# Altium footprint library Hydrolib_pcb.PcbLib: 101 footprints (part 5 of 7)
Each footprint in its own frame and in the unit in brackets; x right, y up, seen from the top. Pads: shape width x height; smd on the part's side, far side on the other; paste and mask are expansions set on the pad; w line width, h text height; cw(c..) or ccw(c..) is an arc to the next point about the centre after c.
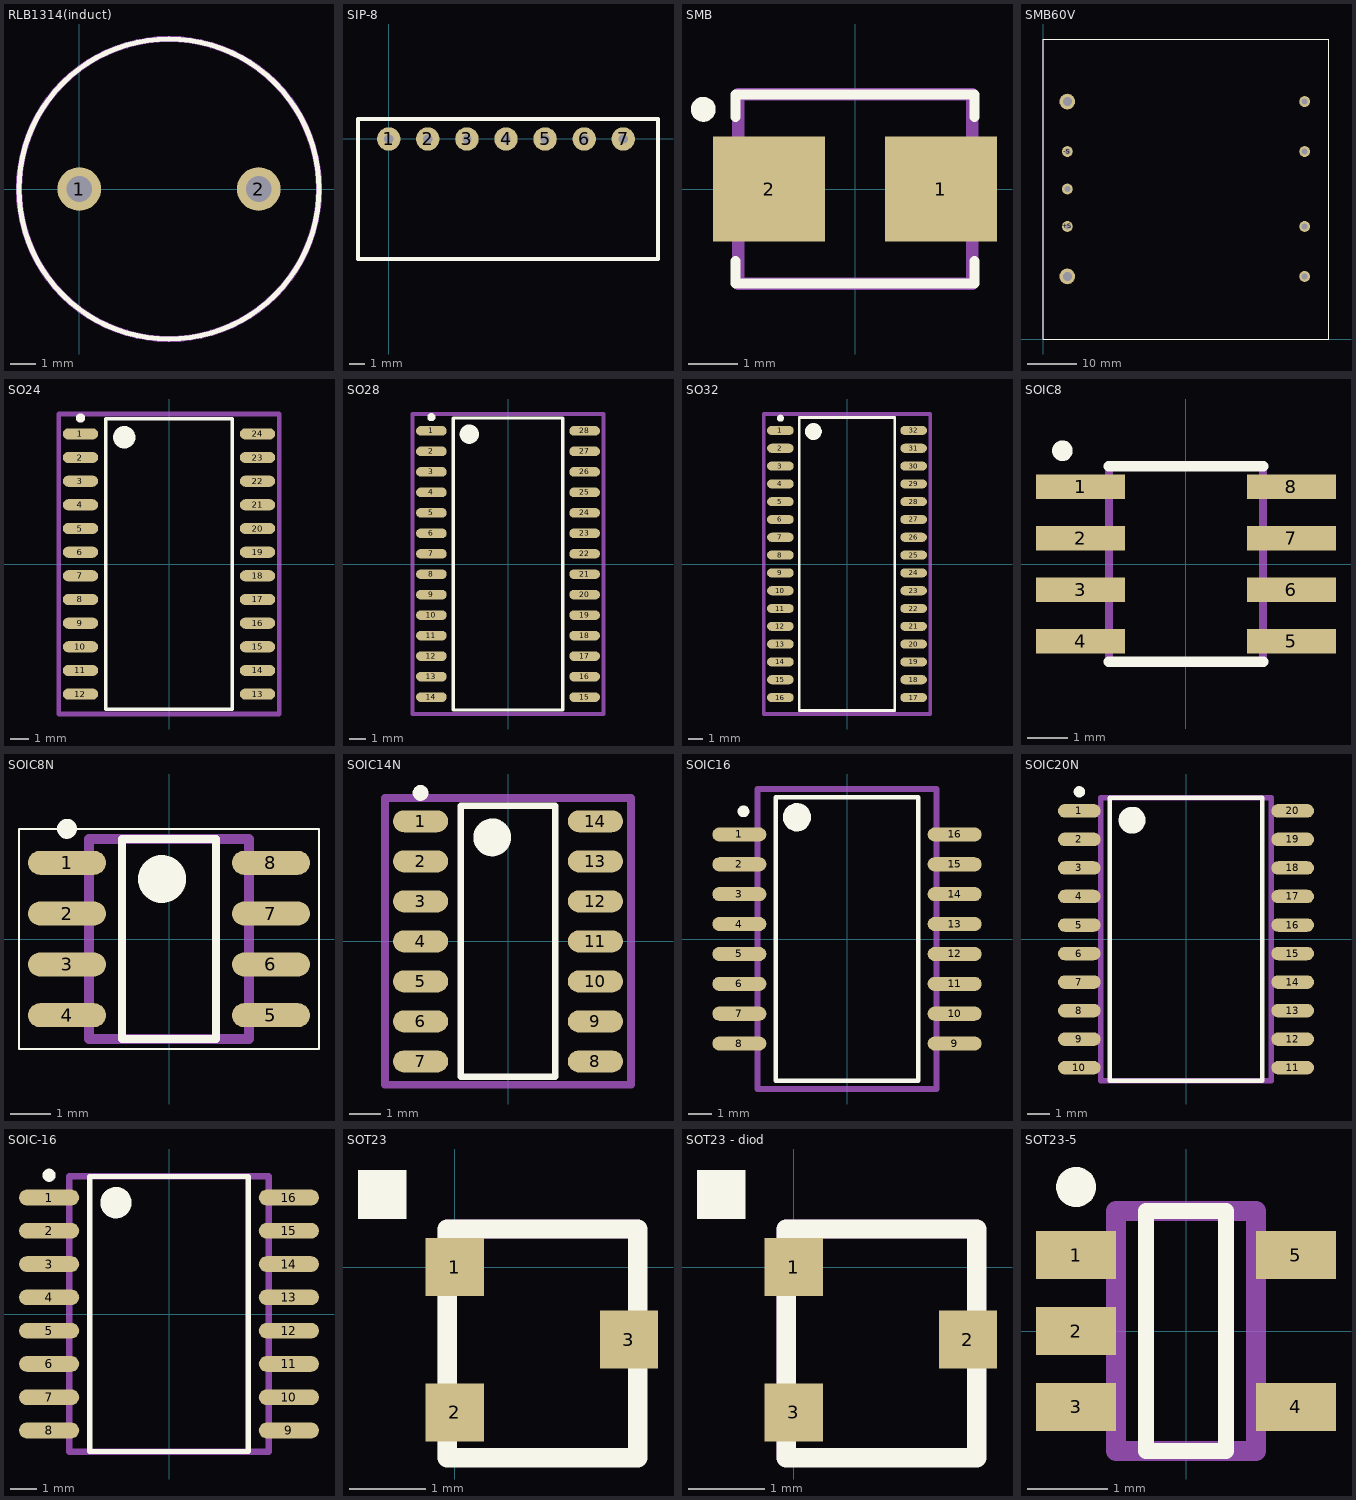
[diagram p4: the footprints below, top view; thin cyan lines are the x and y axes]

## RLB1314(induct) [mm]
pads (2):
  round 1.7 hole 1: 1(0,0) 2(7,0)
Top Overlay:
  circle w0.2: c3.5,0 r5.85
Pattern top:
  circle w0.25: c3.5,0 r5.85
  text ".Designator" at -1.5,-0.4 h2.15
3D body "rlb1314.step": height 12, standoff -15, extent -2.35,-5.95 9.35,5.75

## SIP-8 [mil]
pads (7):
  round 60 hole 23.62: 1(0,0) 2(100,0) 3(200,0) 4(300,0) 5(400,0) 6(500,0) 7(600,0)
Top Overlay:
  lines w9.84: -78.74,51.18 688.98,51.18 688.98,-307.09 ; 688.98,-307.09 688.98,-307.09
  lines w10: -78.74,51.18 -78.74,-307.09 688.98,-307.09

## SMB [mm] "Diod"
height 2.4
pads (2):
  rect 2.25x2.1 smd: 1(1.725,0) 2(-1.725,0)
Top Overlay:
  circle w0.25: c-3.05,1.6 r0.125
  lines w0.2: -2.4,-1.45 -2.4,-1.9 2.4,-1.9 2.4,-1.45 ; -2.4,1.45 -2.4,1.9 2.4,1.9 2.4,1.45
Pattern top:
  lines w0.25: -2.35,-1.9 -2.35,1.9 2.35,1.9 2.35,-1.9 -2.35,-1.9
  text ".Designator" at -3.3,2.2 h2.15
3D body "SMB.step": height 2.4, standoff 0, extent -2.57,-1.9 2.57,1.9

## SMB60V [mm]
height 13
pads (9):
  round 2.2 hole 1.2: +S(4.875,22.88) +Vin(53.125,12.72) -S(4.875,38.12) -Vin(53.125,48.28) GND(53.125,38.12) ON/OFF(53.125,22.88) Trim(4.875,30.5)
  round 3.2 hole 1.8: +Vout(4.875,12.72) -Vout(4.875,48.28)
Top Overlay:
  lines w0.254: 0,0 58,0 58,61 0,61 0,0
Pattern top:
  lines w0.22: 0,0 0,61 58,61 58,0 0,0
  text ".Designator" at 23.1,39.5 h2.15
3D body: height 13, standoff 0, extent -0.127,-0.127 58.127,61.127

## SO24 [mm] "SOP, 24-Leads, Body 15,40x7,50mm, Pitch 1,27mm, IPC Medium Density"
height 2.65
pads (24):
  oval 1.9x0.6 smd: 1(-4.75,6.985) 2(-4.75,5.715) 3(-4.75,4.445) 4(-4.75,3.175) 5(-4.75,1.905) 6(-4.75,0.635) 7(-4.75,-0.635) 8(-4.75,-1.905) 9(-4.75,-3.175) 10(-4.75,-4.445) 11(-4.75,-5.715) 12(-4.75,-6.985) 13(4.75,-6.985) 14(4.75,-5.715) 15(4.75,-4.445) 16(4.75,-3.175) 17(4.75,-1.905) 18(4.75,-0.635) 19(4.75,0.635) 20(4.75,1.905) 21(4.75,3.175) 22(4.75,4.445) 23(4.75,5.715) 24(4.75,6.985)
Top Overlay:
  circle w0.6: c-2.4,6.8 r0.3
  circle w0.25: c-4.75,7.835 r0.125
  lines w0.2: -3.4,-7.8 3.4,-7.8 3.4,7.8 -3.4,7.8 -3.4,-7.8
Pattern top:
  lines w0.25: -5.925,-8.05 5.925,-8.05 5.925,8.05 -5.925,8.05 -5.925,-8.05
3D body "SOP127P1030X265-24N.step": height 2.65, standoff 0, extent -5.162,-7.8 5.162,7.8

## SO28 [mm]
height 2.65
pads (28):
  oval 1.9x0.6 smd: 1(-4.75,8.255) 2(-4.75,6.985) 3(-4.75,5.715) 4(-4.75,4.445) 5(-4.75,3.175) 6(-4.75,1.905) 7(-4.75,0.635) 8(-4.75,-0.635) 9(-4.75,-1.905) 10(-4.75,-3.175) 11(-4.75,-4.445) 12(-4.75,-5.715) 13(-4.75,-6.985) 14(-4.75,-8.255) 15(4.75,-8.255) 16(4.75,-6.985) 17(4.75,-5.715) 18(4.75,-4.445) 19(4.75,-3.175) 20(4.75,-1.905) 21(4.75,-0.635) 22(4.75,0.635) 23(4.75,1.905) 24(4.75,3.175) 25(4.75,4.445) 26(4.75,5.715) 27(4.75,6.985) 28(4.75,8.255)
Top Overlay:
  circle w0.6: c-2.4,8.05 r0.3
  circle w0.25: c-4.75,9.105 r0.125
  lines w0.2: -3.4,-9.05 3.4,-9.05 3.4,9.05 -3.4,9.05 -3.4,-9.05
Pattern top:
  lines w0.25: -5.925,-9.3 5.925,-9.3 5.925,9.3 -5.925,9.3 -5.925,-9.3
  text ".Designator" at 0.2,-4.5 h2.15
3D body "SO28.step": height 2.65, standoff 0, extent -5.162,-9.05 5.162,9.05

## SO32 [mm] "SOP, 32-Leads, Body 20,72x7,51mm, Pitch 1,27mm, IPC Medium Density"
height 2.54
pads (32):
  oval 1.9x0.65 smd: 1(-4.75,9.525) 2(-4.75,8.255) 3(-4.75,6.985) 4(-4.75,5.715) 5(-4.75,4.445) 6(-4.75,3.175) 7(-4.75,1.905) 8(-4.75,0.635) 9(-4.75,-0.635) 10(-4.75,-1.905) 11(-4.75,-3.175) 12(-4.75,-4.445) 13(-4.75,-5.715) 14(-4.75,-6.985) 15(-4.75,-8.255) 16(-4.75,-9.525) 17(4.75,-9.525) 18(4.75,-8.255) 19(4.75,-6.985) 20(4.75,-5.715) 21(4.75,-4.445) 22(4.75,-3.175) 23(4.75,-1.905) 24(4.75,-0.635) 25(4.75,0.635) 26(4.75,1.905) 27(4.75,3.175) 28(4.75,4.445) 29(4.75,5.715) 30(4.75,6.985) 31(4.75,8.255) 32(4.75,9.525)
Top Overlay:
  circle w0.25: c-4.75,10.4 r0.125
  circle w0.6: c-2.4,9.45 r0.3
  lines w0.2: -3.4,-10.45 -3.4,10.45 3.4,10.45 3.4,-10.45 -3.4,-10.45
Pattern top:
  lines w0.25: -5.925,-10.7 -5.925,10.7 5.925,10.7 5.925,-10.7 -5.925,-10.7
  text ".Designator" at 0.5,-4.7 h2.15
3D body "SO32.step": height 2.54, standoff 0, extent -5.232,-10.45 5.232,10.45

## SOIC8 [mm]
pads (8):
  rect 2.2x0.6 smd: 1(-2.6,1.905) 2(-2.6,0.635) 3(-2.6,-0.635) 4(-2.6,-1.905) 5(2.6,-1.905) 6(2.6,-0.635) 7(2.6,0.635) 8(2.6,1.905)
Top Overlay:
  circle w0.254: c-3.048,2.794 r0.127
  lines w0.254: -1.905,-2.413 1.905,-2.413 ; -1.905,2.413 1.905,2.413
3D top:
  lines w0.203: -1.4,-2.4 1.9,-2.4
Pattern top:
  lines w0.203: -1.4,-2.4 -1.9,-2.4 -1.9,2.4 -1.4,2.4 1.9,2.4 1.9,-2.4
  text ".Designator" at 0.5,3.775 h2.15
3D body "L9616-TR.STEP": height 1.75, standoff 0, extent -3.127,-2.45 2.873,2.45

## SOIC8N [mm] "SOIC, 8-Leads, Body 4,90x3,90mm, Pitch 1,27mm, IPC Medium Density"
height 1.75
pads (8):
  oval 1.95x0.6 smd: 1(-2.55,1.905) 2(-2.55,0.635) 3(-2.55,-0.635) 4(-2.55,-1.905) 5(2.55,-1.905) 6(2.55,-0.635) 7(2.55,0.635) 8(2.55,1.905)
Top Overlay:
  circle w0.25: c-2.55,2.755 r0.125
  circle w0.6: c-0.175,1.5 r0.3
  lines w0.05: -3.75,-2.75 -3.75,2.75 3.75,2.75 3.75,-2.75 -3.75,-2.75
  lines w0.2: -1.175,-2.5 -1.175,2.5 1.175,2.5 1.175,-2.5 -1.175,-2.5
Pattern top:
  lines w0.25: -2,-2.5 -2,2.5 2,2.5 2,-2.5 -2,-2.5
  text ".Designator" at 0.6,-2.1 h2.15
3D body: height 1.75, standoff 0.2, extent -2,-2.5 2,2.5

## SOIC14N [mm] "SOIC, 14-Leads, Body 8,65x3,90mm, Pitch 1,27mm, IPC Medium Density"
height 1.75
pads (14):
  oval 1.75x0.7 smd: 1(-2.775,3.81) 2(-2.775,2.54) 3(-2.775,1.27) 4(-2.775,0) 5(-2.775,-1.27) 6(-2.775,-2.54) 7(-2.775,-3.81) 8(2.775,-3.81) 9(2.775,-2.54) 10(2.775,-1.27) 11(2.775,0) 12(2.775,1.27) 13(2.775,2.54) 14(2.775,3.81)
Top Overlay:
  circle w0.6: c-0.5,3.3 r0.3
  circle w0.25: c-2.775,4.71 r0.125
  lines w0.2: -1.5,-4.3 1.5,-4.3 1.5,4.3 -1.5,4.3 -1.5,-4.3
Pattern top:
  lines w0.25: -3.9,-4.55 3.9,-4.55 3.9,4.55 -3.9,4.55 -3.9,-4.55
  text ".Designator" at 0.8,-4.6 h2.13
3D body "SOIC127P600X175-14N.step": height 1.75, standoff 0, extent -3,-4.3 3,4.3

## SOIC16 [mm] "SOIC, 16-Leads, Body 10,30x7,50mm, Pitch 1,27mm, IPC Medium Density"
height 2.65
pads (16):
  oval 2.3x0.6 smd: 1(-4.575,4.445) 2(-4.575,3.175) 3(-4.575,1.905) 4(-4.575,0.635) 5(-4.575,-0.635) 6(-4.575,-1.905) 7(-4.575,-3.175) 8(-4.575,-4.445) 9(4.575,-4.445) 10(4.575,-3.175) 11(4.575,-1.905) 12(4.575,-0.635) 13(4.575,0.635) 14(4.575,1.905) 15(4.575,3.175) 16(4.575,4.445)
Top Overlay:
  circle w0.6: c-2.125,5.175 r0.3
  circle w0.25: c-4.4,5.425 r0.125
  lines w0.2: -3.025,-6.025 3.025,-6.025 3.025,6.025 -3.025,6.025 -3.025,-6.025
Pattern top:
  lines w0.25: -3.8,-6.375 3.8,-6.375 3.8,6.375 -3.8,6.375 -3.8,-6.375
  text ".Designator" at 0,10.203 h2.15
3D body: height 2.65, standoff 0.2, extent -3.8,-5.25 3.8,5.25

## SOIC20N [mm] "SOIC, 20-Leads, Body 12,80x7,50mm, Pitch 1,27mm, IPC Medium Density"
height 2.65
pads (20):
  oval 1.9x0.6 smd: 1(-4.75,5.715) 2(-4.75,4.445) 3(-4.75,3.175) 4(-4.75,1.905) 5(-4.75,0.635) 6(-4.75,-0.635) 7(-4.75,-1.905) 8(-4.75,-3.175) 9(-4.75,-4.445) 10(-4.75,-5.715) 11(4.75,-5.715) 12(4.75,-4.445) 13(4.75,-3.175) 14(4.75,-1.905) 15(4.75,-0.635) 16(4.75,0.635) 17(4.75,1.905) 18(4.75,3.175) 19(4.75,4.445) 20(4.75,5.715)
Top Overlay:
  circle w0.6: c-2.4,5.3 r0.3
  circle w0.25: c-4.75,6.565 r0.125
  lines w0.2: -3.4,-6.3 3.4,-6.3 3.4,6.3 -3.4,6.3 -3.4,-6.3
Pattern top:
  lines w0.25: -3.8,-6.3 3.8,-6.3 3.8,6.3 -3.8,6.3 -3.8,-6.3
  text "String" at -2.9,7.5 h2.13
3D body: height 2.65, standoff 0.1, extent -3.8,-6.3 3.8,6.3

## SOIC-16 [mm] "SOIC, 16-Leads, Body 10,30x7,50mm, Pitch 1,27mm, IPC Medium Density"
height 2.65
pads (16):
  oval 2.3x0.6 smd: 1(-4.575,4.445) 2(-4.575,3.175) 3(-4.575,1.905) 4(-4.575,0.635) 5(-4.575,-0.635) 6(-4.575,-1.905) 7(-4.575,-3.175) 8(-4.575,-4.445) 9(4.575,-4.445) 10(4.575,-3.175) 11(4.575,-1.905) 12(4.575,-0.635) 13(4.575,0.635) 14(4.575,1.905) 15(4.575,3.175) 16(4.575,4.445)
Top Overlay:
  circle w0.25: c-4.575,5.295 r0.125
  circle w0.6: c-2.025,4.25 r0.3
  lines w0.2: -3.025,-5.25 -3.025,5.25 3.025,5.25 3.025,-5.25 -3.025,-5.25
Pattern top:
  lines w0.25: -3.8,-5.25 -3.8,5.25 3.8,5.25 3.8,-5.25 -3.8,-5.25
  text ".Designator" at 0,10.203 h2.15
3D body: height 2.65, standoff 0.2, extent -3.8,-5.25 3.8,5.25

## SOT23 [mil]
height 118.11
pads (3):
  rect 30x30 smd: 1(0,0) 2(0,-75) 3(90,-37.5)
Top Overlay:
  region: -50,25 -25,25 -25,50 -50,50
  lines w10: -3.94,-98.43 94.49,-98.43 94.49,19.68 -3.94,19.68 -3.94,-98.43
Pattern top:
  lines w9.84: -3.94,-98.43 94.49,-98.43 94.49,19.68 -3.94,19.68 -3.94,-98.43
  text ".Designator" at 149.61,196.96 h84.65
3D body "SOT-23.step": height 41.34, standoff -1.97, extent -4,-97 94.43,21.11

## SOT23 - diod [mil]
height 118.11
pads (3):
  rect 30x30 smd: 1(0,0) 2(90,-37.5) 3(0,-75)
Top Overlay:
  region: -50,25 -25,25 -25,50 -50,50
  lines w10: -3.94,-98.43 94.49,-98.43 94.49,19.68 -3.94,19.68 -3.94,-98.43
Pattern top:
  lines w9.84: -3.94,-98.43 94.49,-98.43 94.49,19.68 -3.94,19.68 -3.94,-98.43
  text ".Designator" at 149.61,196.96 h84.65
3D body "SOT-23.step": height 41.34, standoff -1.97, extent -4,-97 94.43,21.11

## SOT23-5 [mm] "SOT23-5, max999"
height 1.45
pads (5):
  rect 1x0.6 smd: 1(-1.375,0.95) 2(-1.375,0) 3(-1.375,-0.95) 4(1.375,-0.95) 5(1.375,0.95)
Top Overlay:
  circle w0.25: c-1.375,1.8 r0.125
  lines w0.2: -0.5,-1.5 0.5,-1.5 0.5,1.5 -0.5,1.5 -0.5,-1.5
Pattern top:
  lines w0.25: -0.875,-1.5 -0.875,1.5 0.875,1.5 0.875,-1.5 -0.875,-1.5
  text ".Designator" at 0.5,-2.7 h2.15
3D body: height 1.45, standoff 0.01, extent -0.875,-1.5 0.875,1.5